# Altium footprint library Miscellaneous SMD.PcbLib: 82 footprints (part 2 of 7) (continued)
## HIROSE_DF13-4P-1.25H(50) [mm] "Pitch 1.25mm, Single Row, 4 Contacts, Right Angle SMT Header, Series DF13"
height 3.6
pads (8):
  rect 0.7x1.8 smd: 1(1.875,3.3) 2(0.625,3.3) 3(-0.625,3.3) 4(-1.875,3.3)
  rect 1.6x2.2 smd: MEC1(-4.125,0) MEC2(4.125,0)
  round 0.5 hole 0.95 unplated mask+0.225: P1(-2.925,1.9) P2(2.925,1.9)
Top Overlay:
  circle w0.25: c3,3.176 r0.125
  lines w0.2: -4.075,-1.45 -4.075,-1.7 -3.325,-1.7 ; -4.075,1.45 -4.075,1.7 -3.7,1.7 ; -3.699,1.699 ccw(c-3.725,1.3) -3.725,1.7 -3.825,1.7 -3.825,1.5 -3.725,1.5 cw(c-3.725,1.3) -3.593,1.45 ; -3.593,-1.45 cw(c-3.725,-1.3) -3.725,-1.5 -3.825,-1.5 -3.825,-1.7 -3.725,-1.7 ccw(c-3.725,-1.3) -3.354,-1.45 ; -3.325,-1.45 -3.325,-2.7 3.325,-2.7 3.325,-1.45 ; 3.325,-1.7 4.075,-1.7 4.075,-1.45 ; 3.354,-1.45 ccw(c3.725,-1.3) 3.725,-1.7 3.825,-1.7 3.825,-1.5 3.725,-1.5 cw(c3.725,-1.3) 3.593,-1.45 ; 3.593,1.45 cw(c3.725,1.3) 3.725,1.5 3.825,1.5 3.825,1.7 3.725,1.7 ccw(c3.725,1.3) 3.699,1.699 ; 3.7,1.7 4.075,1.7 4.075,1.45
Mechanical 8:
  circle w0.1: c2.925,1.9 r0.45
  circle w0.1: c-2.925,1.9 r0.45
  lines w0.1: -4.625,0 -4.125,0 ; -4.125,-0.5 -4.125,0 ; -4.125,0.5 -4.125,0 ; -3.625,0 -4.125,0 ; -3.425,1.9 -2.925,1.9 ; -2.925,1.4 -2.925,1.9 ; -2.925,2.4 -2.925,1.9 ; -2.425,1.9 -2.925,1.9 ; -2.375,3.3 -1.875,3.3 ; -1.875,2.8 -1.875,3.3 ; -1.875,3.8 -1.875,3.3 ; -1.375,3.3 -1.875,3.3 ; -1.125,3.3 -0.625,3.3 ; -0.625,2.8 -0.625,3.3 ; -0.625,3.8 -0.625,3.3 ; -0.5,0 0,0 ; -0.125,3.3 -0.625,3.3 ; 0,-0.5 0,0 ; 0,0.5 0,0 ; 0.125,3.3 0.625,3.3 ; 0.5,0 0,0 ; 0.625,2.8 0.625,3.3 ; 0.625,3.8 0.625,3.3 ; 1.125,3.3 0.625,3.3 ; 1.375,3.3 1.875,3.3 ; 1.875,2.8 1.875,3.3 ; 1.875,3.8 1.875,3.3 ; 2.375,3.3 1.875,3.3 ; 2.425,1.9 2.925,1.9 ; 2.925,1.4 2.925,1.9 ; 2.925,2.4 2.925,1.9 ; 3.425,1.9 2.925,1.9 ; 3.625,0 4.125,0 ; 4.125,-0.5 4.125,0 ; 4.125,0.5 4.125,0 ; 4.625,0 4.125,0 ; -4.925,-1.1 -4.925,1.1 -3.325,1.1 -3.325,-1.1 -4.925,-1.1 ; -2.225,2.4 -2.225,4.2 -1.525,4.2 -1.525,2.4 -2.225,2.4 ; -0.975,2.4 -0.975,4.2 -0.275,4.2 -0.275,2.4 -0.975,2.4 ; 0.275,2.4 0.275,4.2 0.975,4.2 0.975,2.4 0.275,2.4 ; 1.525,2.4 1.525,4.2 2.225,4.2 2.225,2.4 1.525,2.4 ; 3.325,-1.1 3.325,1.1 4.925,1.1 4.925,-1.1 3.325,-1.1
Mechanical 14:
  circle w0.25: c3,3.176 r0.125
  lines w0.1: -4.075,-0.9 -4.075,-1.7 -3.325,-1.7 ; -4.075,0.9 -4.075,1.7 -3.325,1.7 ; -3.525,-0.9 -4.825,-0.9 -4.825,0.9 -3.525,0.9 ; -3.325,-1.3 cw(c-3.725,-1.3) -3.725,-1.7 -3.825,-1.7 -3.825,-1.5 -3.725,-1.5 ccw(c-3.725,-1.3) -3.525,-1.3 -3.525,1.3 ccw(c-3.725,1.3) -3.725,1.5 -3.825,1.5 -3.825,1.7 -3.725,1.7 cw(c-3.725,1.3) -3.325,1.3 ; -2.05,2.3 -2.05,3.5 -1.975,3.8 -1.775,3.8 -1.7,3.5 -1.7,2.3 ; -0.8,2.3 -0.8,3.5 -0.725,3.8 -0.525,3.8 -0.45,3.5 -0.45,2.3 ; 0.45,2.3 0.45,3.5 0.525,3.8 0.725,3.8 0.8,3.5 0.8,2.3 ; 1.7,2.3 1.7,3.5 1.775,3.8 1.975,3.8 2.05,3.5 2.05,2.3 ; 3.325,-1.7 4.075,-1.7 4.075,-0.9 ; 3.325,-1.3 ccw(c3.725,-1.3) 3.725,-1.7 3.825,-1.7 3.825,-1.5 3.725,-1.5 cw(c3.725,-1.3) 3.525,-1.3 3.525,1.3 cw(c3.725,1.3) 3.725,1.5 3.825,1.5 3.825,1.7 3.725,1.7 ccw(c3.725,1.3) 3.325,1.3 ; 3.325,1.7 4.075,1.7 4.075,0.9 ; 3.525,-0.9 4.825,-0.9 4.825,0.9 3.525,0.9 ; -3.325,-2.7 -3.325,2.3 3.325,2.3 3.325,-2.7 -3.325,-2.7
Mechanical 15:
  lines w0.05: -5.175,-1.35 -5.175,1.35 -4.325,1.35 -4.325,1.95 -3.575,1.95 -3.575,2.55 -2.475,2.55 -2.475,4.45 2.475,4.45 2.475,2.55 3.575,2.55 3.575,1.95 4.325,1.95 4.325,1.35 5.175,1.35 5.175,-1.35 4.325,-1.35 4.325,-1.95 3.575,-1.95 3.575,-2.95 -3.575,-2.95 -3.575,-1.95 -4.325,-1.95 -4.325,-1.35 -5.175,-1.35
3D body "HIROSE_DF13-4P-1.25H(50).stp": height 3.6, standoff -0.8, extent -4.825,-2.7 4.825,3.8

## HIROSE_DF13-4P-1.25V(50) [mm] "Pitch 1.25mm, Single Row, 4 Contacts, Straight SMT Header, Series DF13"
height 4.8
pads (8):
  rect 0.7x1.8 smd: 1(-1.875,2.7) 2(-0.625,2.7) 3(0.625,2.7) 4(1.875,2.7)
  rect 0.5x0.5 smd paste-0.25 mask-0.25: MEC1(-4.125,0) MEC2(4.125,0)
  round 0.5 hole 0.95 unplated mask+0.225: P1(-2.925,-1.3) P2(2.925,-1.3)
Top Layer:
  region: -4.925,-1.1 -3.543,-1.1 -3.527,-1.055 -3.484,-0.968 -3.428,-0.889 -3.362,-0.819 -3.325,-0.788 -3.325,1.1 -4.925,1.1
  region: 3.543,-1.1 3.527,-1.055 3.484,-0.968 3.428,-0.889 3.362,-0.819 3.325,-0.788 3.325,1.1 4.925,1.1 4.925,-1.1
Top Layer keep-out:
  lines w0.1: -2.225,-0.67 -2.225,1.7 2.225,1.7 2.225,-0.67 -2.225,-0.67
Top Overlay:
  circle w0.25: c-3,2.75 r0.125
  lines w0.2: -4.075,-1.45 -4.075,-1.7 -3.618,-1.7 ; -4.075,1.45 -4.075,1.7 -2.575,1.7 ; -3.825,-1.7 -3.825,-1.5 -3.725,-1.5 ccw(c-3.725,-1.3) -3.7,-1.498 ; -3.825,1.7 -3.825,1.5 -3.725,1.5 cw(c-3.725,1.3) -3.593,1.45 ; -3.725,1.7 cw(c-3.725,1.3) -3.354,1.45 ; -3.325,1.45 -3.325,1.7 ; -2.975,0.09 -2.825,0.09 ; -2.975,0.89 -2.825,0.89 ; -2.825,-0.506 -2.825,1.05 0,1.05 2.825,1.05 2.825,-0.506 ; -2.35,1.05 -2.35,1.45 ; -2.232,-1.7 0,-1.7 2.232,-1.7 ; -2.125,-1.3 0,-1.3 2.125,-1.3 ; 0.525,-0.39 0.525,-0.59 ; 2.35,1.05 2.35,1.45 ; 2.575,1.7 4.075,1.7 4.075,1.45 ; 2.825,-0.09 2.975,-0.09 ; 3.325,1.45 3.325,1.7 ; 3.354,1.45 cw(c3.725,1.3) 3.725,1.7 ; 3.593,1.45 cw(c3.725,1.3) 3.725,1.5 3.825,1.5 3.825,1.7 ; 3.618,-1.7 4.075,-1.7 4.075,-1.45 ; 3.7,-1.498 ccw(c3.725,-1.3) 3.725,-1.5 3.825,-1.5 3.825,-1.7 ; -2.05,-0.665 -1.7,-0.665 ; -2.05,-0.665 -2.05,-0.315 ; -2.05,-0.665 -1.975,-0.59 ; -2.05,-0.315 -1.7,-0.315 ; -2.05,-0.315 -1.975,-0.39 ; -1.975,-0.59 -1.775,-0.59 ; -1.975,-0.59 -1.975,-0.39 ; -1.975,-0.39 -1.775,-0.39 ; -1.775,-0.59 -1.775,-0.39 ; -1.775,-0.59 -1.7,-0.665 ; -1.775,-0.39 -1.7,-0.315 ; -1.7,-0.665 -1.7,-0.315 ; -0.8,-0.665 -0.45,-0.665 ; -0.8,-0.665 -0.8,-0.315 ; -0.8,-0.665 -0.725,-0.59 ; -0.8,-0.315 -0.45,-0.315 ; -0.8,-0.315 -0.725,-0.39 ; -0.725,-0.59 -0.525,-0.59 ; -0.725,-0.59 -0.725,-0.39 ; -0.725,-0.39 -0.525,-0.39 ; -0.525,-0.59 -0.525,-0.39 ; -0.525,-0.59 -0.45,-0.665 ; -0.525,-0.39 -0.45,-0.315 ; -0.45,-0.665 -0.45,-0.315 ; 0.45,-0.665 0.8,-0.665 ; 0.45,-0.665 0.45,-0.315 ; 0.45,-0.665 0.525,-0.59 ; 0.45,-0.315 0.8,-0.315 ; 0.45,-0.315 0.525,-0.39 0.725,-0.39 ; 0.525,-0.59 0.725,-0.59 ; 0.725,-0.59 0.725,-0.39 ; 0.725,-0.59 0.8,-0.665 ; 0.725,-0.39 0.8,-0.315 ; 0.8,-0.665 0.8,-0.315 ; 1.7,-0.665 2.05,-0.665 ; 1.7,-0.665 1.7,-0.315 ; 1.7,-0.665 1.775,-0.59 ; 1.7,-0.315 2.05,-0.315 ; 1.7,-0.315 1.775,-0.39 ; 1.775,-0.59 1.975,-0.59 ; 1.775,-0.59 1.775,-0.39 ; 1.775,-0.39 1.975,-0.39 ; 1.975,-0.59 1.975,-0.39 ; 1.975,-0.59 2.05,-0.665 ; 1.975,-0.39 2.05,-0.315 ; 2.05,-0.665 2.05,-0.315
Mechanical 8:
  circle w0.1: c2.925,-1.3 r0.45
  circle w0.1: c-2.925,-1.3 r0.45
  lines w0.1: -4.625,0 -4.125,0 ; -4.125,-0.5 -4.125,0 ; -4.125,0.5 -4.125,0 ; -3.625,0 -4.125,0 ; -3.425,-1.3 -2.925,-1.3 ; -2.925,-1.8 -2.925,-1.3 ; -2.925,-0.8 -2.925,-1.3 ; -2.425,-1.3 -2.925,-1.3 ; -2.375,2.7 -1.875,2.7 ; -1.875,2.2 -1.875,2.7 ; -1.875,3.2 -1.875,2.7 ; -1.375,2.7 -1.875,2.7 ; -1.125,2.7 -0.625,2.7 ; -0.625,2.2 -0.625,2.7 ; -0.625,3.2 -0.625,2.7 ; -0.5,0.515 0,0.515 ; -0.354,-0.354 0,0 ; -0.354,0.354 0,0 ; -0.125,2.7 -0.625,2.7 ; 0,1.015 0,0.515 ; 0.125,2.7 0.625,2.7 ; 0.354,-0.354 0,0 ; 0.354,0.354 0,0 ; 0.5,0.515 0,0.515 ; 0.625,2.2 0.625,2.7 ; 0.625,3.2 0.625,2.7 ; 1.125,2.7 0.625,2.7 ; 1.375,2.7 1.875,2.7 ; 1.875,2.2 1.875,2.7 ; 1.875,3.2 1.875,2.7 ; 2.375,2.7 1.875,2.7 ; 2.425,-1.3 2.925,-1.3 ; 2.925,-1.8 2.925,-1.3 ; 2.925,-0.8 2.925,-1.3 ; 3.425,-1.3 2.925,-1.3 ; 3.625,0 4.125,0 ; 4.125,-0.5 4.125,0 ; 4.125,0.5 4.125,0 ; 4.625,0 4.125,0 ; -4.925,-1.1 -4.925,1.1 -3.325,1.1 -3.325,-0.788 ccw(c-2.925,-1.3) -3.543,-1.1 -4.925,-1.1 ; -2.225,-0.67 0,-0.67 2.225,-0.67 2.225,1.7 0,1.7 -2.225,1.7 -2.225,-0.67 ; -2.225,1.8 -1.525,1.8 -1.525,3.6 -2.225,3.6 -2.225,1.8 ; -0.975,1.8 -0.275,1.8 -0.275,3.6 -0.975,3.6 -0.975,1.8 ; 0.275,1.8 0.975,1.8 0.975,3.6 0.275,3.6 0.275,1.8 ; 1.525,1.8 2.225,1.8 2.225,3.6 1.525,3.6 1.525,1.8 ; 3.325,-0.788 cw(c2.925,-1.3) 3.543,-1.1 4.925,-1.1 4.925,1.1 3.325,1.1 3.325,-0.788
Mechanical 14:
  circle w0.25: c-3,2.75 r0.125
  lines w0.1: -4.825,-0.9 -3.525,-0.9 ; -4.823,-0.9 -4.825,0.9 -3.525,0.9 ; -4.625,-0.9 -4.625,0.9 ; -4.625,-0.25 -4.025,-0.25 -4.025,0.25 -4.625,0.25 ; -4.075,-0.9 -4.075,-1.7 0,-1.7 4.075,-1.7 4.075,-0.9 ; -4.075,0.9 -4.075,1.7 0,1.7 4.075,1.7 4.075,0.9 ; -3.825,-1.7 -3.825,-1.5 -3.725,-1.5 ccw(c-3.725,-1.3) -3.525,-1.3 -3.525,1.3 ccw(c-3.725,1.3) -3.725,1.5 -3.825,1.5 -3.825,1.7 ; -3.725,-1.7 ccw(c-3.725,-1.3) -3.325,-1.3 ; -3.725,1.7 cw(c-3.725,1.3) -3.325,1.3 ; -3.325,-1.7 -3.325,1.7 ; -3.325,0.09 -2.825,0.09 ; -3.325,0.89 -2.825,0.89 ; -2.35,1.05 -2.35,1.7 ; 0.525,-0.39 0.525,-0.59 ; 2.35,1.05 2.35,1.7 ; 2.825,-0.89 3.325,-0.89 ; 2.825,-0.09 3.325,-0.09 ; 3.325,-1.7 3.325,1.7 ; 3.325,-1.3 ccw(c3.725,-1.3) 3.725,-1.7 ; 3.325,1.3 cw(c3.725,1.3) 3.725,1.7 ; 3.525,-0.9 4.825,-0.9 4.823,0.9 ; 3.525,0.9 4.825,0.9 ; 3.825,-1.7 3.825,-1.5 3.725,-1.5 cw(c3.725,-1.3) 3.525,-1.3 3.525,1.3 cw(c3.725,1.3) 3.725,1.5 3.825,1.5 3.825,1.7 ; 4.625,-0.9 4.625,0.9 ; 4.625,-0.25 4.025,-0.25 4.025,0.25 4.625,0.25 ; -2.05,-0.665 -1.7,-0.665 ; -2.05,-0.665 -2.05,-0.315 ; -2.05,-0.665 -1.975,-0.59 ; -2.05,-0.315 -1.7,-0.315 ; -2.05,-0.315 -1.975,-0.39 ; -1.975,-0.59 -1.775,-0.59 ; -1.975,-0.59 -1.975,-0.39 ; -1.975,-0.39 -1.775,-0.39 ; -1.775,-0.59 -1.775,-0.39 ; -1.775,-0.59 -1.7,-0.665 ; -1.775,-0.39 -1.7,-0.315 ; -1.7,-0.665 -1.7,-0.315 ; -0.8,-0.665 -0.45,-0.665 ; -0.8,-0.665 -0.8,-0.315 ; -0.8,-0.665 -0.725,-0.59 ; -0.8,-0.315 -0.45,-0.315 ; -0.8,-0.315 -0.725,-0.39 ; -0.725,-0.59 -0.525,-0.59 ; -0.725,-0.59 -0.725,-0.39 ; -0.725,-0.39 -0.525,-0.39 ; -0.525,-0.59 -0.525,-0.39 ; -0.525,-0.59 -0.45,-0.665 ; -0.525,-0.39 -0.45,-0.315 ; -0.45,-0.665 -0.45,-0.315 ; 0.45,-0.665 0.8,-0.665 ; 0.45,-0.665 0.45,-0.315 ; 0.45,-0.665 0.525,-0.59 ; 0.45,-0.315 0.8,-0.315 ; 0.45,-0.315 0.525,-0.39 0.725,-0.39 ; 0.525,-0.59 0.725,-0.59 ; 0.725,-0.59 0.725,-0.39 ; 0.725,-0.59 0.8,-0.665 ; 0.725,-0.39 0.8,-0.315 ; 0.8,-0.665 0.8,-0.315 ; 1.7,-0.665 2.05,-0.665 ; 1.7,-0.665 1.7,-0.315 ; 1.7,-0.665 1.775,-0.59 ; 1.7,-0.315 2.05,-0.315 ; 1.7,-0.315 1.775,-0.39 ; 1.775,-0.59 1.975,-0.59 ; 1.775,-0.59 1.775,-0.39 ; 1.775,-0.39 1.975,-0.39 ; 1.975,-0.59 1.975,-0.39 ; 1.975,-0.59 2.05,-0.665 ; 1.975,-0.39 2.05,-0.315 ; 2.05,-0.665 2.05,-0.315 ; -2.825,-1.3 -2.825,1.05 0,1.05 2.825,1.05 2.825,-1.3 0,-1.3 -2.825,-1.3
Mechanical 15:
  lines w0.05: -5.175,-1.95 0,-1.95 5.175,-1.95 5.175,2.05 2.475,2.05 2.475,3.85 0,3.85 -2.475,3.85 -2.475,1.95 -5.175,1.95 -5.175,-1.95
3D body "HIROSE_DF13-4P-1.25V(50).stp": height 4.8, standoff -0.8, extent -4.825,-1.7 4.825,3.2

## HIROSE_DF13-5P-1.25V(50) [mm] "Pitch 1.25mm, Single Row, 5 Contacts, Straight SMT Header, Series DF13"
height 4.8
pads (9):
  rect 0.7x1.8 smd: 1(-2.5,2.7) 2(-1.25,2.7) 3(0,2.7) 4(1.25,2.7) 5(2.5,2.7)
  rect 0.5x0.5 smd paste-0.25 mask-0.25: MEC1(-4.75,0) MEC2(4.75,0)
  round 0.5 hole 0.95 unplated mask+0.225: P1(-3.55,-1.3) P2(3.55,-1.3)
Top Layer:
  region: 4.168,-1.1 4.152,-1.055 4.109,-0.968 4.053,-0.889 3.987,-0.819 3.95,-0.788 3.95,1.1 5.55,1.1 5.55,-1.1
  region: -5.55,-1.1 -4.168,-1.1 -4.152,-1.055 -4.109,-0.968 -4.053,-0.889 -3.987,-0.819 -3.95,-0.788 -3.95,1.1 -5.55,1.1
Top Layer keep-out:
  lines w0.1: -2.85,-0.67 -2.85,1.7 2.85,1.7 2.85,-0.67 -2.85,-0.67
Top Overlay:
  circle w0.25: c-3.625,2.7 r0.125
  lines w0.2: -4.7,-1.45 -4.7,-1.7 -4.243,-1.7 ; -4.7,1.45 -4.7,1.7 -3.2,1.7 ; -4.45,-1.7 -4.45,-1.5 -4.35,-1.5 ccw(c-4.35,-1.3) -4.325,-1.498 ; -4.45,1.7 -4.45,1.5 -4.35,1.5 cw(c-4.35,1.3) -4.218,1.45 ; -4.35,1.7 cw(c-4.35,1.3) -3.979,1.45 ; -3.95,1.45 -3.95,1.7 ; -3.6,0.09 -3.45,0.09 ; -3.6,0.89 -3.45,0.89 ; -3.45,-0.506 -3.45,1.05 3.45,1.05 3.45,-0.506 ; -2.975,1.05 -2.975,1.45 ; -2.857,-1.7 2.857,-1.7 ; -2.75,-1.3 2.75,-1.3 ; 2.975,1.05 2.975,1.45 ; 3.2,1.7 4.7,1.7 4.7,1.45 ; 3.45,-0.09 3.6,-0.09 ; 3.95,1.45 3.95,1.7 ; 3.979,1.45 cw(c4.35,1.3) 4.35,1.7 ; 4.218,1.45 cw(c4.35,1.3) 4.35,1.5 4.45,1.5 4.45,1.7 ; 4.243,-1.7 4.7,-1.7 4.7,-1.45 ; 4.325,-1.498 ccw(c4.35,-1.3) 4.35,-1.5 4.45,-1.5 4.45,-1.7 ; -2.675,-0.665 -2.6,-0.59 ; -2.675,-0.665 -2.675,-0.315 ; -2.675,-0.665 -2.325,-0.665 ; -2.675,-0.315 -2.6,-0.39 ; -2.675,-0.315 -2.325,-0.315 ; -2.6,-0.59 -2.6,-0.39 ; -2.6,-0.59 -2.4,-0.59 ; -2.6,-0.39 -2.4,-0.39 ; -2.4,-0.59 -2.325,-0.665 ; -2.4,-0.59 -2.4,-0.39 ; -2.4,-0.39 -2.325,-0.315 ; -2.325,-0.665 -2.325,-0.315 ; -1.425,-0.665 -1.35,-0.59 ; -1.425,-0.665 -1.425,-0.315 ; -1.425,-0.665 -1.075,-0.665 ; -1.425,-0.315 -1.35,-0.39 ; -1.425,-0.315 -1.075,-0.315 ; -1.35,-0.59 -1.35,-0.39 ; -1.35,-0.59 -1.15,-0.59 ; -1.35,-0.39 -1.15,-0.39 ; -1.15,-0.59 -1.075,-0.665 ; -1.15,-0.59 -1.15,-0.39 ; -1.15,-0.39 -1.075,-0.315 ; -1.075,-0.665 -1.075,-0.315 ; -0.175,-0.665 -0.1,-0.59 ; -0.175,-0.665 -0.175,-0.315 ; -0.175,-0.665 0.175,-0.665 ; -0.175,-0.315 -0.1,-0.39 ; -0.175,-0.315 0.175,-0.315 ; -0.1,-0.59 -0.1,-0.39 ; -0.1,-0.59 0.1,-0.59 ; -0.1,-0.39 0.1,-0.39 ; 0.1,-0.59 0.175,-0.665 ; 0.1,-0.59 0.1,-0.39 ; 0.1,-0.39 0.175,-0.315 ; 0.175,-0.665 0.175,-0.315 ; 1.075,-0.665 1.15,-0.59 ; 1.075,-0.665 1.075,-0.315 ; 1.075,-0.665 1.425,-0.665 ; 1.075,-0.315 1.15,-0.39 ; 1.075,-0.315 1.425,-0.315 ; 1.15,-0.59 1.15,-0.39 ; 1.15,-0.59 1.35,-0.59 ; 1.15,-0.39 1.35,-0.39 ; 1.35,-0.59 1.425,-0.665 ; 1.35,-0.59 1.35,-0.39 ; 1.35,-0.39 1.425,-0.315 ; 1.425,-0.665 1.425,-0.315 ; 2.325,-0.665 2.4,-0.59 ; 2.325,-0.665 2.325,-0.315 ; 2.325,-0.665 2.675,-0.665 ; 2.325,-0.315 2.4,-0.39 ; 2.325,-0.315 2.675,-0.315 ; 2.4,-0.59 2.4,-0.39 ; 2.4,-0.59 2.6,-0.59 ; 2.4,-0.39 2.6,-0.39 ; 2.6,-0.59 2.675,-0.665 ; 2.6,-0.59 2.6,-0.39 ; 2.6,-0.39 2.675,-0.315 ; 2.675,-0.665 2.675,-0.315
Mechanical 8:
  circle w0.1: c-3.55,-1.3 r0.45
  circle w0.1: c3.55,-1.3 r0.45
  lines w0.1: -5.25,0 -4.75,0 ; -4.75,-0.5 -4.75,0 ; -4.75,0.5 -4.75,0 ; -4.25,0 -4.75,0 ; -4.05,-1.3 -3.55,-1.3 ; -3.55,-1.8 -3.55,-1.3 ; -3.55,-0.8 -3.55,-1.3 ; -3.05,-1.3 -3.55,-1.3 ; -3,2.7 -2.5,2.7 ; -2.5,2.2 -2.5,2.7 ; -2.5,3.2 -2.5,2.7 ; -2,2.7 -2.5,2.7 ; -1.75,2.7 -1.25,2.7 ; -1.25,2.2 -1.25,2.7 ; -1.25,3.2 -1.25,2.7 ; -0.75,2.7 -1.25,2.7 ; -0.5,0.515 0,0.515 ; -0.5,2.7 0,2.7 ; -0.354,-0.354 0,0 ; -0.354,0.354 0,0 ; 0,1.015 0,0.515 ; 0,2.2 0,2.7 ; 0,3.2 0,2.7 ; 0.354,-0.354 0,0 ; 0.354,0.354 0,0 ; 0.5,0.515 0,0.515 ; 0.5,2.7 0,2.7 ; 0.75,2.7 1.25,2.7 ; 1.25,2.2 1.25,2.7 ; 1.25,3.2 1.25,2.7 ; 1.75,2.7 1.25,2.7 ; 2,2.7 2.5,2.7 ; 2.5,2.2 2.5,2.7 ; 2.5,3.2 2.5,2.7 ; 3,2.7 2.5,2.7 ; 3.05,-1.3 3.55,-1.3 ; 3.55,-1.8 3.55,-1.3 ; 3.55,-0.8 3.55,-1.3 ; 4.05,-1.3 3.55,-1.3 ; 4.25,0 4.75,0 ; 4.75,-0.5 4.75,0 ; 4.75,0.5 4.75,0 ; 5.25,0 4.75,0 ; -5.55,-1.1 -4.168,-1.1 cw(c-3.55,-1.3) -3.95,-0.788 -3.95,1.1 -5.55,1.1 -5.55,-1.1 ; -2.85,-0.67 -2.85,1.7 2.85,1.7 2.85,-0.67 -2.85,-0.67 ; -2.85,1.8 -2.85,3.6 -2.15,3.6 -2.15,1.8 -2.85,1.8 ; -1.6,1.8 -1.6,3.6 -0.9,3.6 -0.9,1.8 -1.6,1.8 ; -0.35,1.8 -0.35,3.6 0.35,3.6 0.35,1.8 -0.35,1.8 ; 0.9,1.8 0.9,3.6 1.6,3.6 1.6,1.8 0.9,1.8 ; 2.15,1.8 2.15,3.6 2.85,3.6 2.85,1.8 2.15,1.8 ; 3.95,-0.788 cw(c3.55,-1.3) 4.168,-1.1 5.55,-1.1 5.55,1.1 3.95,1.1 3.95,-0.788
Mechanical 14:
  circle w0.25: c-3.625,2.7 r0.125
  lines w0.1: -5.45,-0.9 -4.15,-0.9 ; -5.448,-0.9 -5.45,0.9 -4.15,0.9 ; -5.25,-0.9 -5.25,0.9 ; -5.25,-0.25 -4.65,-0.25 -4.65,0.25 -5.25,0.25 ; -4.7,-0.9 -4.7,-1.7 4.7,-1.7 4.7,-0.9 ; -4.7,0.9 -4.7,1.7 4.7,1.7 4.7,0.9 ; -4.45,-1.7 -4.45,-1.5 -4.35,-1.5 ccw(c-4.35,-1.3) -4.15,-1.3 -4.15,1.3 ccw(c-4.35,1.3) -4.35,1.5 -4.45,1.5 -4.45,1.7 ; -4.35,-1.7 ccw(c-4.35,-1.3) -3.95,-1.3 ; -4.35,1.7 cw(c-4.35,1.3) -3.95,1.3 ; -3.95,-1.7 -3.95,1.7 ; -3.95,0.09 -3.45,0.09 ; -3.95,0.89 -3.45,0.89 ; -2.975,1.05 -2.975,1.7 ; 2.975,1.05 2.975,1.7 ; 3.45,-0.89 3.95,-0.89 ; 3.45,-0.09 3.95,-0.09 ; 3.95,-1.7 3.95,1.7 ; 3.95,-1.3 ccw(c4.35,-1.3) 4.35,-1.7 ; 3.95,1.3 cw(c4.35,1.3) 4.35,1.7 ; 4.15,-0.9 5.45,-0.9 5.448,0.9 ; 4.15,0.9 5.45,0.9 ; 4.45,-1.7 4.45,-1.5 4.35,-1.5 cw(c4.35,-1.3) 4.15,-1.3 4.15,1.3 cw(c4.35,1.3) 4.35,1.5 4.45,1.5 4.45,1.7 ; 5.25,-0.9 5.25,0.9 ; 5.25,-0.25 4.65,-0.25 4.65,0.25 5.25,0.25 ; -2.675,-0.665 -2.6,-0.59 ; -2.675,-0.665 -2.675,-0.315 ; -2.675,-0.665 -2.325,-0.665 ; -2.675,-0.315 -2.6,-0.39 ; -2.675,-0.315 -2.325,-0.315 ; -2.6,-0.59 -2.6,-0.39 ; -2.6,-0.59 -2.4,-0.59 ; -2.6,-0.39 -2.4,-0.39 ; -2.4,-0.59 -2.325,-0.665 ; -2.4,-0.59 -2.4,-0.39 ; -2.4,-0.39 -2.325,-0.315 ; -2.325,-0.665 -2.325,-0.315 ; -1.425,-0.665 -1.35,-0.59 ; -1.425,-0.665 -1.425,-0.315 ; -1.425,-0.665 -1.075,-0.665 ; -1.425,-0.315 -1.35,-0.39 ; -1.425,-0.315 -1.075,-0.315 ; -1.35,-0.59 -1.35,-0.39 ; -1.35,-0.59 -1.15,-0.59 ; -1.35,-0.39 -1.15,-0.39 ; -1.15,-0.59 -1.075,-0.665 ; -1.15,-0.59 -1.15,-0.39 ; -1.15,-0.39 -1.075,-0.315 ; -1.075,-0.665 -1.075,-0.315 ; -0.175,-0.665 -0.1,-0.59 ; -0.175,-0.665 -0.175,-0.315 ; -0.175,-0.665 0.175,-0.665 ; -0.175,-0.315 -0.1,-0.39 ; -0.175,-0.315 0.175,-0.315 ; -0.1,-0.59 -0.1,-0.39 ; -0.1,-0.59 0.1,-0.59 ; -0.1,-0.39 0.1,-0.39 ; 0.1,-0.59 0.175,-0.665 ; 0.1,-0.59 0.1,-0.39 ; 0.1,-0.39 0.175,-0.315 ; 0.175,-0.665 0.175,-0.315 ; 1.075,-0.665 1.15,-0.59 ; 1.075,-0.665 1.075,-0.315 ; 1.075,-0.665 1.425,-0.665 ; 1.075,-0.315 1.15,-0.39 ; 1.075,-0.315 1.425,-0.315 ; 1.15,-0.59 1.15,-0.39 ; 1.15,-0.59 1.35,-0.59 ; 1.15,-0.39 1.35,-0.39 ; 1.35,-0.59 1.425,-0.665 ; 1.35,-0.59 1.35,-0.39 ; 1.35,-0.39 1.425,-0.315 ; 1.425,-0.665 1.425,-0.315 ; 2.325,-0.665 2.4,-0.59 ; 2.325,-0.665 2.325,-0.315 ; 2.325,-0.665 2.675,-0.665 ; 2.325,-0.315 2.4,-0.39 ; 2.325,-0.315 2.675,-0.315 ; 2.4,-0.59 2.4,-0.39 ; 2.4,-0.59 2.6,-0.59 ; 2.4,-0.39 2.6,-0.39 ; 2.6,-0.59 2.675,-0.665 ; 2.6,-0.59 2.6,-0.39 ; 2.6,-0.39 2.675,-0.315 ; 2.675,-0.665 2.675,-0.315 ; -3.45,-1.3 3.45,-1.3 3.45,1.05 -3.45,1.05 -3.45,-1.3
Mechanical 15:
  lines w0.05: -5.8,-1.95 -5.8,1.95 -3.1,1.95 -3.1,3.85 3.1,3.85 3.1,2.05 5.8,2.05 5.8,-1.95 -5.8,-1.95
3D body "HIROSE_DF13-5P-1.25V(50).stp": height 4.8, standoff -0.8, extent -5.45,-1.7 5.45,3.2

## HIROSE_DF13-6P-1.25V(50) [mm] "Pitch 1.25mm, Single Row, 6 Contacts, Straight SMT Header, Series DF13"
height 4.8
pads (10):
  rect 0.7x1.8 smd: 1(-3.125,2.7) 2(-1.875,2.7) 3(-0.625,2.7) 4(0.625,2.7) 5(1.875,2.7) 6(3.125,2.7)
  rect 0.5x0.5 smd paste-0.25 mask-0.25: MEC1(-5.375,0) MEC2(5.375,0)
  round 0.5 hole 0.95 unplated mask+0.225: P1(-4.175,-1.3) P2(4.175,-1.3)
Top Layer:
  region: -6.175,-1.1 -4.793,-1.1 -4.777,-1.055 -4.734,-0.968 -4.678,-0.889 -4.612,-0.819 -4.575,-0.788 -4.575,1.1 -6.175,1.1
  region: 4.794,-1.1 4.777,-1.055 4.734,-0.968 4.679,-0.889 4.612,-0.819 4.575,-0.788 4.575,1.1 6.175,1.1 6.175,-1.1
Top Layer keep-out:
  lines w0.1: -3.475,-0.67 3.475,-0.67 3.475,1.7 -3.475,1.7 -3.475,-0.67
Top Overlay:
  lines w0.2: -5.325,-1.45 -5.325,-1.7 -4.868,-1.7 ; -5.325,1.45 -5.325,1.7 -3.825,1.7 ; -5.075,-1.7 -5.075,-1.5 -4.975,-1.5 ccw(c-4.975,-1.3) -4.95,-1.498 ; -5.075,1.7 -5.075,1.5 -4.975,1.5 cw(c-4.975,1.3) -4.843,1.45 ; -4.975,1.7 cw(c-4.975,1.3) -4.604,1.45 ; -4.575,1.45 -4.575,1.7 ; -4.225,0.09 -4.075,0.09 ; -4.225,0.89 -4.075,0.89 ; -4.075,-0.506 -4.075,1.05 4.075,1.05 4.075,-0.506 ; -3.6,1.05 -3.6,1.45 ; -3.482,-1.7 3.482,-1.7 ; -3.375,-1.3 3.375,-1.3 ; 0.525,-0.39 0.525,-0.59 ; 3.6,1.05 3.6,1.45 ; 3.825,1.7 5.325,1.7 5.325,1.45 ; 4.075,-0.09 4.225,-0.09 ; 4.575,1.45 4.575,1.7 ; 4.604,1.45 cw(c4.975,1.3) 4.975,1.7 ; 4.843,1.45 cw(c4.975,1.3) 4.975,1.5 5.075,1.5 5.075,1.7 ; 4.868,-1.7 5.325,-1.7 5.325,-1.45 ; 4.95,-1.498 ccw(c4.975,-1.3) 4.975,-1.5 5.075,-1.5 5.075,-1.7 ; -3.3,-0.665 -3.225,-0.59 ; -3.3,-0.665 -3.3,-0.315 ; -3.3,-0.665 -2.95,-0.665 ; -3.3,-0.315 -3.225,-0.39 ; -3.3,-0.315 -2.95,-0.315 ; -3.225,-0.59 -3.225,-0.39 ; -3.225,-0.59 -3.025,-0.59 ; -3.225,-0.39 -3.025,-0.39 ; -3.025,-0.59 -2.95,-0.665 ; -3.025,-0.59 -3.025,-0.39 ; -3.025,-0.39 -2.95,-0.315 ; -2.95,-0.665 -2.95,-0.315 ; -2.05,-0.665 -1.975,-0.59 ; -2.05,-0.665 -2.05,-0.315 ; -2.05,-0.665 -1.7,-0.665 ; -2.05,-0.315 -1.975,-0.39 ; -2.05,-0.315 -1.7,-0.315 ; -1.975,-0.59 -1.975,-0.39 ; -1.975,-0.59 -1.775,-0.59 ; -1.975,-0.39 -1.775,-0.39 ; -1.775,-0.59 -1.7,-0.665 ; -1.775,-0.59 -1.775,-0.39 ; -1.775,-0.39 -1.7,-0.315 ; -1.7,-0.665 -1.7,-0.315 ; -0.8,-0.665 -0.725,-0.59 ; -0.8,-0.665 -0.8,-0.315 ; -0.8,-0.665 -0.45,-0.665 ; -0.8,-0.315 -0.725,-0.39 ; -0.8,-0.315 -0.45,-0.315 ; -0.725,-0.59 -0.725,-0.39 ; -0.725,-0.59 -0.525,-0.59 ; -0.725,-0.39 -0.525,-0.39 ; -0.525,-0.59 -0.45,-0.665 ; -0.525,-0.59 -0.525,-0.39 ; -0.525,-0.39 -0.45,-0.315 ; -0.45,-0.665 -0.45,-0.315 ; 0.45,-0.665 0.525,-0.59 ; 0.45,-0.665 0.45,-0.315 ; 0.45,-0.665 0.8,-0.665 ; 0.45,-0.315 0.525,-0.39 0.725,-0.39 ; 0.45,-0.315 0.8,-0.315 ; 0.525,-0.59 0.725,-0.59 ; 0.725,-0.59 0.8,-0.665 ; 0.725,-0.59 0.725,-0.39 ; 0.725,-0.39 0.8,-0.315 ; 0.8,-0.665 0.8,-0.315 ; 1.7,-0.665 1.775,-0.59 ; 1.7,-0.665 1.7,-0.315 ; 1.7,-0.665 2.05,-0.665 ; 1.7,-0.315 1.775,-0.39 ; 1.7,-0.315 2.05,-0.315 ; 1.775,-0.59 1.775,-0.39 ; 1.775,-0.59 1.975,-0.59 ; 1.775,-0.39 1.975,-0.39 ; 1.975,-0.59 2.05,-0.665 ; 1.975,-0.59 1.975,-0.39 ; 1.975,-0.39 2.05,-0.315 ; 2.05,-0.665 2.05,-0.315 ; 2.95,-0.665 3.025,-0.59 ; 2.95,-0.665 2.95,-0.315 ; 2.95,-0.665 3.3,-0.665 ; 2.95,-0.315 3.025,-0.39 ; 2.95,-0.315 3.3,-0.315 ; 3.025,-0.59 3.025,-0.39 ; 3.025,-0.59 3.225,-0.59 ; 3.025,-0.39 3.225,-0.39 ; 3.225,-0.59 3.3,-0.665 ; 3.225,-0.59 3.225,-0.39 ; 3.225,-0.39 3.3,-0.315 ; 3.3,-0.665 3.3,-0.315
Mechanical 8:
  circle w0.1: c-4.175,-1.3 r0.45
  circle w0.1: c4.175,-1.3 r0.45
  lines w0.1: -5.875,0 -5.375,0 ; -5.375,-0.5 -5.375,0 ; -5.375,0.5 -5.375,0 ; -4.875,0 -5.375,0 ; -4.675,-1.3 -4.175,-1.3 ; -4.175,-1.8 -4.175,-1.3 ; -4.175,-0.8 -4.175,-1.3 ; -3.675,-1.3 -4.175,-1.3 ; -3.625,2.7 -3.125,2.7 ; -3.125,2.2 -3.125,2.7 ; -3.125,3.2 -3.125,2.7 ; -2.625,2.7 -3.125,2.7 ; -2.375,2.7 -1.875,2.7 ; -1.875,2.2 -1.875,2.7 ; -1.875,3.2 -1.875,2.7 ; -1.375,2.7 -1.875,2.7 ; -1.125,2.7 -0.625,2.7 ; -0.625,2.2 -0.625,2.7 ; -0.625,3.2 -0.625,2.7 ; -0.5,0.515 0,0.515 ; -0.354,-0.354 0,0 ; -0.354,0.354 0,0 ; -0.125,2.7 -0.625,2.7 ; 0,1.015 0,0.515 ; 0.125,2.7 0.625,2.7 ; 0.354,-0.354 0,0 ; 0.354,0.354 0,0 ; 0.5,0.515 0,0.515 ; 0.625,2.2 0.625,2.7 ; 0.625,3.2 0.625,2.7 ; 1.125,2.7 0.625,2.7 ; 1.375,2.7 1.875,2.7 ; 1.875,2.2 1.875,2.7 ; 1.875,3.2 1.875,2.7 ; 2.375,2.7 1.875,2.7 ; 2.625,2.7 3.125,2.7 ; 3.125,2.2 3.125,2.7 ; 3.125,3.2 3.125,2.7 ; 3.625,2.7 3.125,2.7 ; 3.675,-1.3 4.175,-1.3 ; 4.175,-1.8 4.175,-1.3 ; 4.175,-0.8 4.175,-1.3 ; 4.675,-1.3 4.175,-1.3 ; 4.875,0 5.375,0 ; 5.375,-0.5 5.375,0 ; 5.375,0.5 5.375,0 ; 5.875,0 5.375,0 ; -6.175,-1.1 -4.793,-1.1 cw(c-4.175,-1.3) -4.575,-0.788 -4.575,1.1 -6.175,1.1 -6.175,-1.1 ; -3.475,-0.67 -3.475,1.7 3.475,1.7 3.475,-0.67 -3.475,-0.67 ; -3.475,1.8 -3.475,3.6 -2.775,3.6 -2.775,1.8 -3.475,1.8 ; -2.225,1.8 -2.225,3.6 -1.525,3.6 -1.525,1.8 -2.225,1.8 ; -0.975,1.8 -0.975,3.6 -0.275,3.6 -0.275,1.8 -0.975,1.8 ; 0.275,1.8 0.275,3.6 0.975,3.6 0.975,1.8 0.275,1.8 ; 1.525,1.8 1.525,3.6 2.225,3.6 2.225,1.8 1.525,1.8 ; 2.775,1.8 2.775,3.6 3.475,3.6 3.475,1.8 2.775,1.8 ; 4.575,-0.788 cw(c4.175,-1.3) 4.794,-1.1 6.175,-1.1 6.175,1.1 4.575,1.1 4.575,-0.788
Mechanical 14:
  lines w0.1: -6.075,-0.9 -4.775,-0.9 ; -6.073,-0.9 -6.075,0.9 -4.775,0.9 ; -5.875,-0.9 -5.875,0.9 ; -5.875,-0.25 -5.275,-0.25 -5.275,0.25 -5.875,0.25 ; -5.325,-0.9 -5.325,-1.7 5.325,-1.7 5.325,-0.9 ; -5.325,0.9 -5.325,1.7 4.075,1.7 ; -5.075,-1.7 -5.075,-1.5 -4.975,-1.5 ccw(c-4.975,-1.3) -4.775,-1.3 -4.775,1.3 ccw(c-4.975,1.3) -4.975,1.5 -5.075,1.5 -5.075,1.7 ; -4.975,-1.7 ccw(c-4.975,-1.3) -4.575,-1.3 ; -4.975,1.7 cw(c-4.975,1.3) -4.575,1.3 ; -4.575,-1.7 -4.575,1.7 ; -4.575,0.09 -4.075,0.09 ; -4.575,0.89 -4.075,0.89 ; -3.6,1.05 -3.6,1.7 ; 0.525,-0.39 0.525,-0.59 ; 3.6,1.05 3.6,1.7 ; 4.075,-0.89 4.575,-0.89 ; 4.075,-0.09 4.575,-0.09 ; 4.575,-1.7 4.575,1.7 ; 4.575,-1.3 ccw(c4.975,-1.3) 4.975,-1.7 ; 4.575,1.3 cw(c4.975,1.3) 4.975,1.7 ; 4.775,-0.9 6.075,-0.9 6.073,0.9 ; 4.775,0.9 6.075,0.9 ; 5.075,-1.7 5.075,-1.5 4.975,-1.5 cw(c4.975,-1.3) 4.775,-1.3 4.775,1.3 cw(c4.975,1.3) 4.975,1.5 5.075,1.5 5.075,1.7 ; 5.325,0.9 5.325,1.7 ; 5.875,-0.9 5.875,0.9 ; 5.875,-0.25 5.275,-0.25 5.275,0.25 5.875,0.25 ; -3.3,-0.665 -3.225,-0.59 ; -3.3,-0.665 -3.3,-0.315 ; -3.3,-0.665 -2.95,-0.665 ; -3.3,-0.315 -3.225,-0.39 ; -3.3,-0.315 -2.95,-0.315 ; -3.225,-0.59 -3.225,-0.39 ; -3.225,-0.59 -3.025,-0.59 ; -3.225,-0.39 -3.025,-0.39 ; -3.025,-0.59 -2.95,-0.665 ; -3.025,-0.59 -3.025,-0.39 ; -3.025,-0.39 -2.95,-0.315 ; -2.95,-0.665 -2.95,-0.315 ; -2.05,-0.665 -1.975,-0.59 ; -2.05,-0.665 -2.05,-0.315 ; -2.05,-0.665 -1.7,-0.665 ; -2.05,-0.315 -1.975,-0.39 ; -2.05,-0.315 -1.7,-0.315 ; -1.975,-0.59 -1.975,-0.39 ; -1.975,-0.59 -1.775,-0.59 ; -1.975,-0.39 -1.775,-0.39 ; -1.775,-0.59 -1.7,-0.665 ; -1.775,-0.59 -1.775,-0.39 ; -1.775,-0.39 -1.7,-0.315 ; -1.7,-0.665 -1.7,-0.315 ; -0.8,-0.665 -0.725,-0.59 ; -0.8,-0.665 -0.8,-0.315 ; -0.8,-0.665 -0.45,-0.665 ; -0.8,-0.315 -0.725,-0.39 ; -0.8,-0.315 -0.45,-0.315 ; -0.725,-0.59 -0.725,-0.39 ; -0.725,-0.59 -0.525,-0.59 ; -0.725,-0.39 -0.525,-0.39 ; -0.525,-0.59 -0.45,-0.665 ; -0.525,-0.59 -0.525,-0.39 ; -0.525,-0.39 -0.45,-0.315 ; -0.45,-0.665 -0.45,-0.315 ; 0.45,-0.665 0.525,-0.59 ; 0.45,-0.665 0.45,-0.315 ; 0.45,-0.665 0.8,-0.665 ; 0.45,-0.315 0.525,-0.39 0.725,-0.39 ; 0.45,-0.315 0.8,-0.315 ; 0.525,-0.59 0.725,-0.59 ; 0.725,-0.59 0.8,-0.665 ; 0.725,-0.59 0.725,-0.39 ; 0.725,-0.39 0.8,-0.315 ; 0.8,-0.665 0.8,-0.315 ; 1.7,-0.665 1.775,-0.59 ; 1.7,-0.665 1.7,-0.315 ; 1.7,-0.665 2.05,-0.665 ; 1.7,-0.315 1.775,-0.39 ; 1.7,-0.315 2.05,-0.315 ; 1.775,-0.59 1.775,-0.39 ; 1.775,-0.59 1.975,-0.59 ; 1.775,-0.39 1.975,-0.39 ; 1.975,-0.59 2.05,-0.665 ; 1.975,-0.59 1.975,-0.39 ; 1.975,-0.39 2.05,-0.315 ; 2.05,-0.665 2.05,-0.315 ; 2.95,-0.665 3.025,-0.59 ; 2.95,-0.665 2.95,-0.315 ; 2.95,-0.665 3.3,-0.665 ; 2.95,-0.315 3.025,-0.39 ; 2.95,-0.315 3.3,-0.315 ; 3.025,-0.59 3.025,-0.39 ; 3.025,-0.59 3.225,-0.59 ; 3.025,-0.39 3.225,-0.39 ; 3.225,-0.59 3.3,-0.665 ; 3.225,-0.59 3.225,-0.39 ; 3.225,-0.39 3.3,-0.315 ; 3.3,-0.665 3.3,-0.315 ; -4.075,-1.3 4.075,-1.3 4.075,1.05 -4.075,1.05 -4.075,-1.3
Mechanical 15:
  lines w0.05: -6.425,-1.95 -6.425,1.95 -3.725,1.95 -3.725,3.85 3.725,3.85 3.725,2.05 6.425,2.05 6.425,-1.95 -6.425,-1.95
3D body "HIROSE_DF13-6P-1.25V(50).stp": height 4.8, standoff -0.8, extent -6.075,-1.7 6.075,3.2